# Altium integrated library all_in_one_library.IntLib: 677 symbols (part 1 of 3) (continued)
## CON_USB_mini_B_stoj
designator J?, comment USB
USB mini B THT 0°
footprint USB_MINI_stoj
pins: 1, 2, 3, 4, 5

## CON_zdierka
designator J?, comment Zdierka  (mechanical)
pins: 1

## CON_ZIF_EA_WF100-04S
designator J?
footprint CON_ZIF_EA_WF100-04S
pins: 1, 2, 3, 4

## DIODE_0805
designator D?
0.5A 0805
footprint 0805_SD1
pins: A, K

## DIODE_B130LAW
designator D?, comment B130LAW  (value not drawn)
SCHOT, 1A, 30V, SOD123; Link: http://cz.farnell.com/diodes-inc/b130law-7-f/diode-rec-schot-1a-30v-sod123/dp/1858617
footprint SOD123_DIODE
pins: A, K

## DIODE_B260-13-F
designator D?, comment B260
DIODE, REC, SCHOTTKY, 60V, 2A, SMB; Alias: B260-13-F; Suplier: Farnell
footprint Diode SMB
pins: A, K

## DIODE_CAN_TVS
designator D?
ESDCAN01-2BLY
footprint SOT23M
pins: 1, 2, 3

## DIODE_CHOTTKY_1A_30V_PMEG3010EJ
designator D?, comment PMEG3010EJ
1A, 30V, 560mV max, Schottky diode; Manufacturer: NXP; Case: SOD-323F; I_F: 1A; V_R: 30V; V_F: 560mV; PartNumber: PMEG3010EJ
footprint SOD323F (diode_smd)
pins: A, K

## DIODE_FFP08S60SNTU
designator D?, comment FFP08S60SNTU  (value not drawn)
Stealth DIODE, 600V, 8A FFP08S60SNTU; Alias: FFP08S60SNTU
footprint TO220D 2L (diode)
footprint TO220D 2L PWR (diode)
footprint TO220D 2L BENT (bent 2pin to220)
pins: A, K

## DIODE_IDP08E65D1XKSA1
designator D?, comment IDP08E65D1XKSA1
650V, 16A@25deg IDP08E65D1XKSA1; Current@25deg: 16A; ForwardVoltage: 1.35V; link: http://www.tme.eu/cz/details/idp08e65d1xksa1/univerzalni-diody-tht/infineon-technologies/; BRVoltage: 650V
footprint TO220D 2L (diode)
footprint TO220D 2L PWR (diode)
footprint TO220D 2L BENT (bent 2pin to220)
pins: A, K

## DIODE_MBR4045
designator D?, comment MBR4045
Dual power shotky diode; Suplier: Farnell; Alias: MBR4045
footprint TO-247AC PWR (SIP with Mounting Hole; 3 Leads; Body 20 x 15.6 x 5 mm (typ); Pitch 5.45 mm)
part A pins: 1 A1, 2 K
part B pins: 2 K, 3 A2

## DIODE_PMEG4010ETR
designator D?, comment PMEG4010ETR  (value not drawn)
FAST, SCHOTTKY, 1A, 40V, SOD123; Link: http://cz.farnell.com/nxp/pmeg4010etr/diode-schottky-1a-40v-sod123/dp/2311223
footprint SOD123_DIODE
pins: A, K

## DIODE_RS07J-GS18
designator D?, comment RS07J-GS18  (value not drawn)
D-SWITCH, 600V, 0.5A.DO-219AB; Alias: RS07J-GS18
footprint DO-219AB
pins: A, K

## DIODE_SK54
designator D?, comment SK54
Shottky 40V 5A; Suplier: Farnell; Alias: SK54C
footprint DIODE SMC (DO214AB) (Shottky Diode)
pins: A, K

## DIODE_TL431
designator Reg?
programable zener diode
footprint TL431-SOT23
footprint TO92; pin to pad Anode>2 Cathode>1 Vref>3
pins: Anode, Cathode, Vref

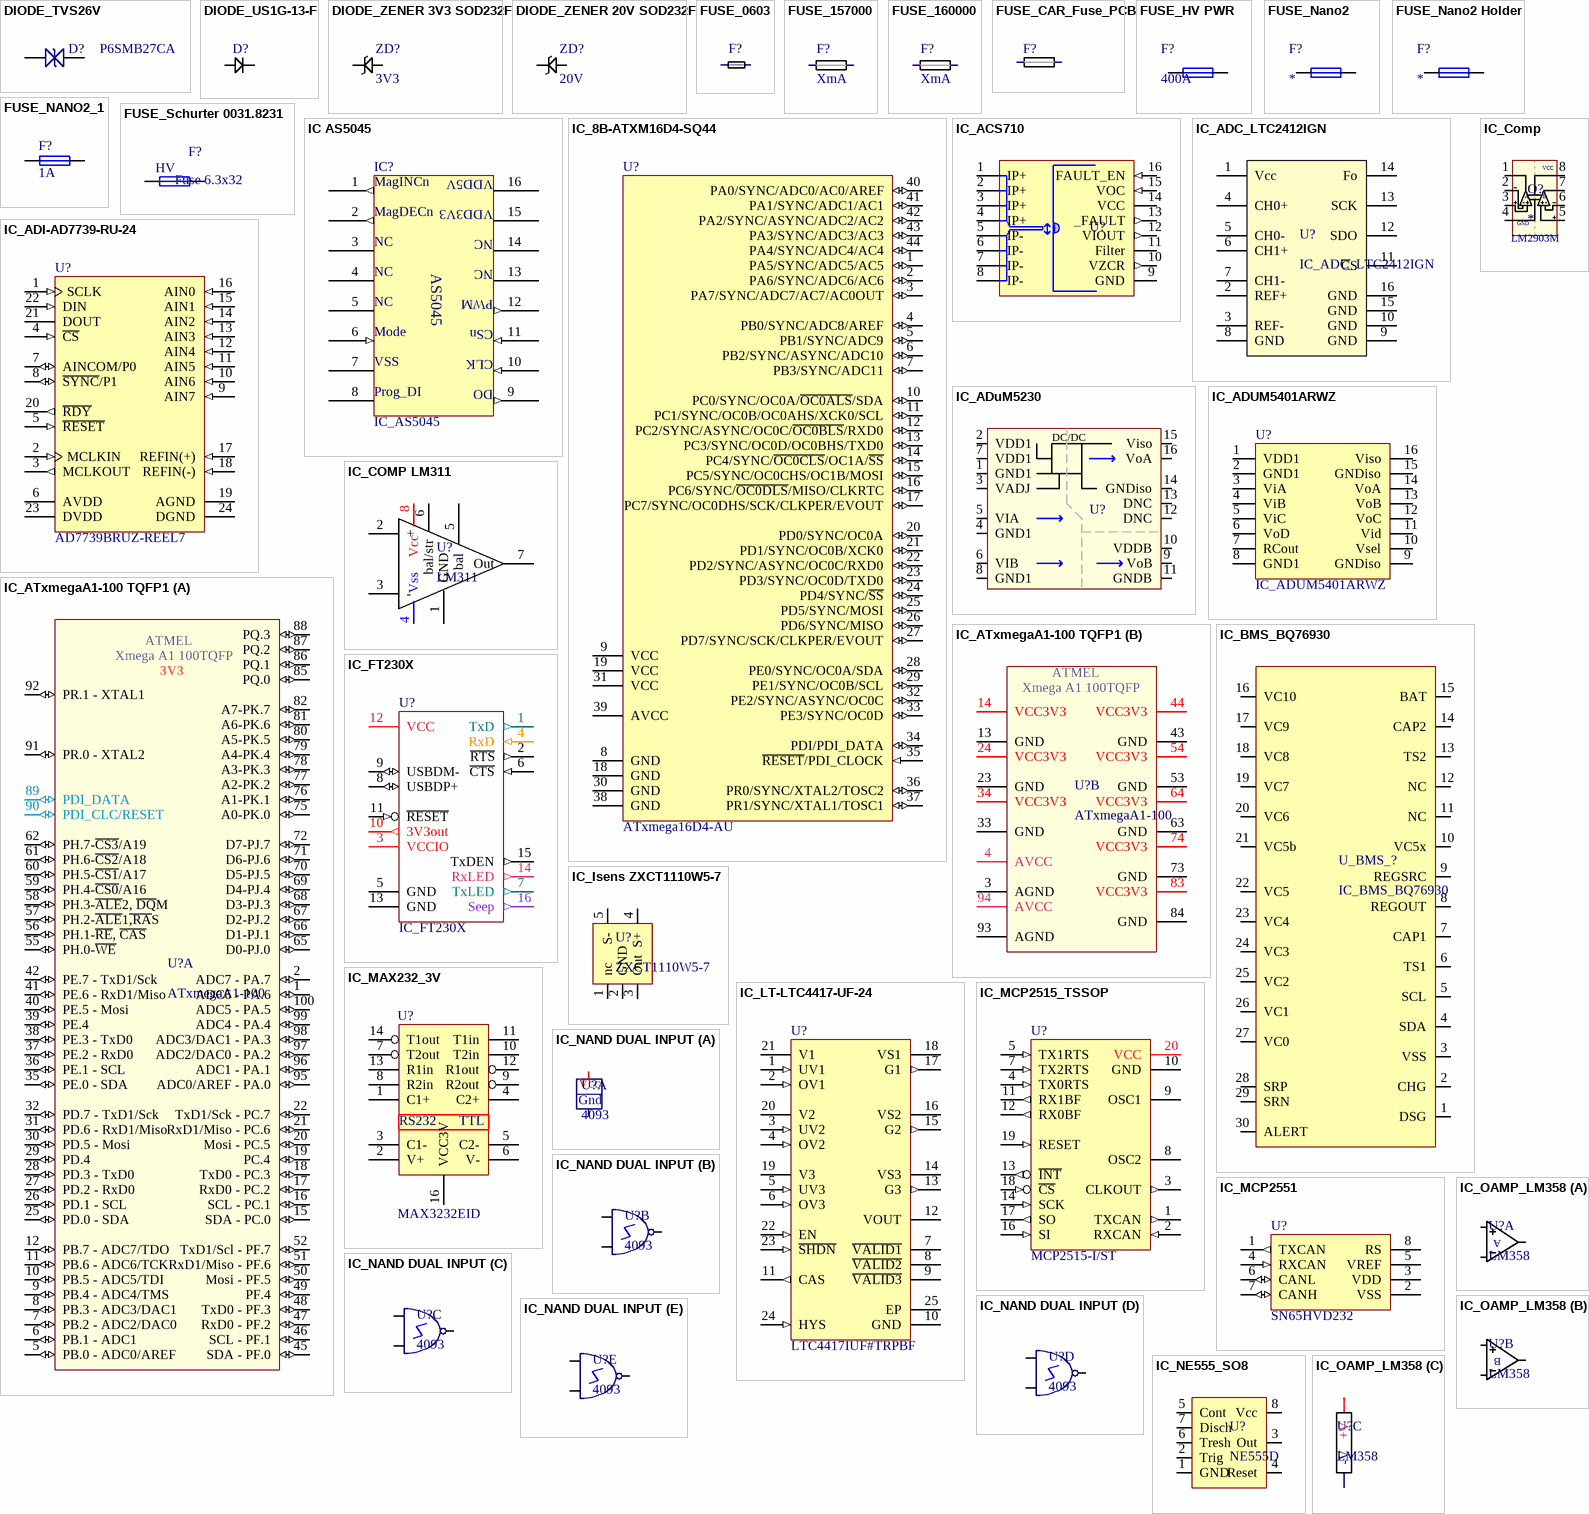
[diagram p4: symbols DIODE_TVS26V to IC_OAMP_LM358]

## DIODE_TVS26V
designator D?, comment P6SMB27CA
TVS DIODE; Alias: P6SMB27CA
footprint Diode SMB
pins: A 1, K 2

## DIODE_US1G-13-F
designator D?, comment US1G-13-F  (value not drawn)
UltraFast, 1A, 400V, SMA; Link: http://cz.farnell.com/diodes-inc/us1g-13-f/diode-rectif-ultra-fast-400v-1a/dp/1858638
footprint SMA_vishay
pins: A, K

## DIODE_ZENER 3V3 SOD232F
designator ZD?, comment 3V3
footprint ZENER SOD323F
pins: A, K

## DIODE_ZENER 20V SOD232F
designator ZD?, comment 20V
Alias: TDZ20J
footprint ZENER SOD323F
pins: A, K

## FUSE_0603
designator F?, comment 0.5A  (value not drawn)
fuse 0603 0.5A
footprint FS_0603 (fuse)
pins: 0, 1

## FUSE_157000
designator F?, comment XmA
2.6x6.1mm 62mA-15A 65/125V; Datasheet: http://www.gme.cz/img/cache/doc/971/020/fsf00-5-smd-datasheet-1.pdf; Supplier: ZVERIMEX
footprint FUSE_type_157000 (2.6x6.1mm)
pins: 0, 1

## FUSE_160000
designator F?, comment XmA
8x4,5x4,5mm 32mA-1A 250VAC; Datasheet: http://www.tme.eu/cz/Document/91a05b3a769bd3327ee844d3ba48aac9/SIBA-GSS-160000.pdf; Supplier: TME
footprint FUSE_160000 (8x4,5x4,5mm-SIBA-FUSES)
pins: 1, 2

## FUSE_CAR_Fuse_PCB
designator F?, comment CAR_fuse  (value not drawn)
Drzak autopojistky PCB 20A 32V
footprint CAR_Fuse_PCB
pins: 0, 1

## FUSE_HV PWR
designator F?, comment 400A
400A SemiC
pins: 1, 2

## FUSE_Nano2
designator F?
Fuse Nano2 bez puzdra
footprint Fuse Nano2
pins: 1, 2

## FUSE_Nano2 Holder
designator F?
Fuse Nano2 s puzdrom
footprint Fuse Nano2 Holder
pins: 1, 2

## FUSE_NANO2_1
designator F?, comment 1A
pojistka NANO2
footprint Fuse Nano2
pins: 1, 2

## FUSE_Schurter 0031.8231
designator F?, comment Fuse 6.3x32  Rating: HV
6.3x32 / 5x20
footprint FUSE 6.3x32mm (case HV)
pins: 1, 2

## IC AS5045
designator IC?, comment IC_AS5045
footprint SSOP16-AS5045 _nohole
footprint SSOP16-AS5045
pins: 1 (out) "MagINCn", 2 (out) "MagDECn", 3 "NC", 4 "NC", 5 "NC", 6 (in) "Mode", 7 (power) "VSS", 8 "Prog_DI", 9 (out) "DO", 10 (in) "CLK", 11 (in) "CSn", 12 (out) "PWM", 13 "NC", 14 "NC", 15 (power) "VDD3V3", 16 (power) "VDD5V"
text: VDD5V; MagINCn; VDD3V3; MagDECn; NC; AS5045; PWM; CSn; Mode; CLK; VSS; DO; Prog_DI

## IC_8B-ATXM16D4-SQ44
designator U?, comment ATxmega16D4-AU
8/16-bit AVR XMEGA D4 Microcontroller, 1.6-3.6V, 32MHz, 16KB + 4KB Flash, 1KB EEPROM, 2KB SRAM, 44-pin TQFP, Industrial Grade (-40°C to 85°C), Pb-Free; Manufacturer: Atmel; PartNumber: ATxmega16D4-AU; RevisionNote: update URL version and symbol Pin7,10,12,14,16,17,27,35,36,37改动; ComponentLink2URL: http://www.atmel.com/Images/Atmel-8135-8-and-16-bit-AVR-microcontroller-ATxmega16D4-32D4-64D4-128D4_datasheet.pdf; PackageDescription: 44-Pin Plastic Thin Profile Quad Flat Pack, 10 x 10 x 1.0 mm Body, 0.8 mm Pitch (TQFP); ComponentLink1Description: Manufacturer URL; Code_JEDEC: MS-026-ACB; ComponentLink2Description: Datasheet; DatasheetVersion: revP, Jan-2014; PackageReference: 44A; ComponentLink1URL: http://www.atmel.com/; PackageVersion: revC, Oct-2010
footprint TQFP44_Atmel
pins: 1 PA5/SYNC/ADC5/AC5 (io), 2 PA6/SYNC/ADC6/AC6 (io), 3 PA7/SYNC/ADC7/AC7/AC0OUT (io), 4 PB0/SYNC/ADC8/AREF (io), 5 PB1/SYNC/ADC9 (io), 6 PB2/SYNC/ASYNC/ADC10 (io), 7 PB3/SYNC/ADC11 (io), 8 GND (power), 9 VCC (power), 10 PC0/SYNC/OC0A/~{OC0ALS}/SDA (io), 11 PC1/SYNC/OC0B/OC0AHS/XCK0/SCL (io), 12 PC2/SYNC/ASYNC/OC0C/~{OC0BLS}/RXD0 (io), 13 PC3/SYNC/OC0D/OC0BHS/TXD0 (io), 14 PC4/SYNC/~{OC0CLS}/OC1A/~{SS} (io), 15 PC5/SYNC/OC0CHS/OC1B/MOSI (io), 16 PC6/SYNC/~{OC0DLS}/MISO/CLKRTC (io), 17 PC7/SYNC/OC0DHS/SCK/CLKPER/EVOUT (io), 18 GND (power), 19 VCC (power), 20 PD0/SYNC/OC0A (io), 21 PD1/SYNC/OC0B/XCK0 (io), 22 PD2/SYNC/ASYNC/OC0C/RXD0 (io), 23 PD3/SYNC/OC0D/TXD0 (io), 24 PD4/SYNC/~{SS} (io), 25 PD5/SYNC/MOSI (io), 26 PD6/SYNC/MISO (io), 27 PD7/SYNC/SCK/CLKPER/EVOUT (io), 28 PE0/SYNC/OC0A/SDA (io), 29 PE1/SYNC/OC0B/SCL (io), 30 GND (power), 31 VCC (power), 32 PE2/SYNC/ASYNC/OC0C (io), 33 PE3/SYNC/OC0D (io), 34 PDI/PDI_DATA (io), 35 ~{RESET}/PDI_CLOCK (in), 36 PR0/SYNC/XTAL2/TOSC2 (io), 37 PR1/SYNC/XTAL1/TOSC1 (io), 38 GND (power), 39 AVCC (power), 40 PA0/SYNC/ADC0/AC0/AREF (io), 41 PA1/SYNC/ADC1/AC1 (io), 42 PA2/SYNC/ASYNC/ADC2/AC2 (io), 43 PA3/SYNC/ADC3/AC3 (io), 44 PA4/SYNC/ADC4/AC4 (io)

## IC_ACS710
designator U?, comment ACS710KLATR  (value not drawn)
Current sensor +-12 +-25A; Alias: ACS710KLATR
footprint SOIC_16o
pins: 1 IP+, 2 IP+, 3 IP+, 4 IP+, 5 IP-, 6 IP-, 7 IP-, 8 IP-, 9 GND, 10 VZCR (out), 11 Filter, 12 VIOUT (out), 13 _FAULT (out), 14 VCC, 15 VOC (in), 16 FAULT_EN (in)

## IC_ADC_LTC2412IGN
designator U?
2 channel diferential sigma delta ADC
footprint SSOP16_N
pins: 1 Vcc (power), 2 REF+ (power), 3 REF- (power), 4 CH0+ (power), 5 CH0- (power), 6 CH1+ (power), 7 CH1- (power), 8 GND (power), 9 GND (power), 10 GND (power), 11 ~{C}S (power), 12 SDO (power), 13 SCK (power), 14 Fo (power), 15 GND (power), 16 GND (power)

## IC_ADI-AD7739-RU-24
designator U?, comment AD7739BRUZ-REEL7
Octal 24-Bit Sigma-Delta Analog-to-Digital Converter with Serial, SPI Interface, 15.1KSPS, -40 to +105 degC, RU-24, Pb-Free, Reel; Manufacturer: Analog Devices; Generic Part Number: AD7739; Channels: 8; Throughput Rate (SPS): 15.1K; Resolution (Bits): 24; Interface: Ser, SPI; PackageReference: RU-24; ComponentLink4Description: Product URL; PackageDescription: 24-Lead Thin Shrink Small Outline Package [TSSOP]; ComponentLink2URL: http://www.analog.com/static/imported-files/data_sheets/AD7739.pdf; ComponentLink4URL: http://www.analog.com/en/analog-to-digital-converters/ad-converters/ad7739/products/product.html; RoHS: Y; DatasheetVersion: Rev.0; ComponentLink3Description: Package Specification; ComponentLink1Description: Manufacturer URL; ComponentLink3URL: http://www.analog.com/static/imported-files/packages/380523655245964505593671154107510036154RU24.pdf; PackageVersion: 2002; ComponentLink1URL: http://www.analog.com/en/index.html; ComponentLink2Description: Datasheet; PartNumber: AD7739BRUZ-REEL7; Packing: Reel; Code_JEDEC: MO-153-AD; Mounting Technology: Surface Mount
footprint TSSOP24_AD
pins: 1 SCLK (in) "Serial Clock. Schmitt triggered logic input. An external serial clock is applied to this input to transfer serial data to or from the AD7739.", 2 MCLKIN (in) "Master Clock Signal for the ADC. This can be provided in the form of a crystal/resonator or external clock. A crystal/resonator can be tied across the MCLKIN and MCLKOUT pins.Alternatively, MCLKIN can be driven with a CMOS (See Datasheet)", 3 MCLKOUT (out) "Master Clock Signal for the ADC. When the master clock for the device is a crystal/resonator, the crystal/resonator is connected between MCLKIN and MCLKOUT. If an external clock is applied to the MCLKIN, MCLKOUT provides an (See Datasheet)", 4 ~{CS} (in) "Chip Select. Active low Schmitt triggered logic input with an internal pull-up resistor.With this input hardwired low, the AD7739 can operate in its 3-wire interface mode using SCLK, DIN, and DOUT. C\S\ can be used to select (See Datasheet)", 5 ~{RESET} (in) "Schmitt Triggered Logic Input. Active low input that resets the control logic, interface logic, digital filter, analog modulator, and all on-chip registers of the part to power-on status. Effectively, everything on the part (See Datasheet)", 6 AVDD (power) "Analog Positive Supply Voltage, 5 V to AGND Nominal.", 7 AINCOM/P0 (io) "Analog Inputs Common Terminal/Digital Output. The function of this pin is determined by the P0 DIR bit in the I/O port register; the digital value can be written as the P0 bit in the I/O port register. The digital voltage is (See Datasheet)", 8 ~{SYNC}/P1 (io) "S\Y\N\C\/Digital Input/Digital Output. The pin direction is determined by the P1 DIR bit;the digital value can be read/written as the P1 bit in the I/O port register. When the SYNC bit in the I/O port register is set to 1, (See Datasheet)", 9 AIN7 (in) "Analog Inputs.", 10 AIN6 (in) "Analog Inputs.", 11 AIN5 (in) "Analog Inputs.", 12 AIN4 (in) "Analog Inputs.", 13 AIN3 (in) "Analog Inputs.", 14 AIN2 (in) "Analog Inputs.", 15 AIN1 (in) "Analog Inputs.", 16 AIN0 (in) "Analog Inputs.", 17 REFIN(+) (in) "Positive Terminal of the Differential Reference Input. REFIN(+) voltage potential can lie anywhere between AVDD and AGND. In normal circuit configuration, this pin should be connected to a 2.5 V reference voltage.", 18 REFIN(-) (in) "Negative Terminal of the Differential Reference Input. REFIN(-) voltage potential can lie anywhere between AVDD and AGND. In normal circuit configuration, this pin should be connected to a 0 V reference voltage.", 19 AGND (power) "Ground Reference Point for Analog Circuitry.", 20 ~{RDY} (out) "Logic Output. Used as a status output in both conversion mode and calibration mode. In conversion mode, a falling edge on this output indicates that either any channel or all channels have unread data available, according to (See Datasheet)", 21 DOUT (hiz) "Serial Data Output. Serial data is read from the output shift register on the part. This output shift register can contain information from any AD7739 register, depending on the address bits of the communications register.", 22 DIN (in) "Serial Data Input (Schmitt Triggered). Serial data is written to the input shift register on the part. Data from this input shift register is transferred to any AD7739 register,depending on the address bits of the (See Datasheet)", 23 DVDD (power) "Digital Supply Voltage, 3 V or 5 V Nominal.", 24 DGND (power) "Ground Reference Point for Digital Circuitry."

## IC_ADuM5230
designator U?  (value not drawn)
Isolated driver with dc/dc 0.1/0.3A; Alias: ADuM5230
footprint SOIC_16o
pins: 1 GND1, 2 VDD1, 3 VADJ (in), 4 GND1, 5 VIA (in), 6 VIB (in), 7 VDD1, 8 GND1, 9 VoB (out), 10 VDDB, 11 GNDB, 12 DNC, 13 DNC, 14 GNDiso, 15 Viso, 16 VoA (out)
text: DC/DC

## IC_ADUM5401ARWZ
designator U?
Quad chanel isolators with DC-DC converter
footprint SOIC_16o
pins: 1 VDD1, 2 GND1, 3 ViA, 4 ViB, 5 ViC, 6 VoD, 7 RCout, 8 GND1, 9 GNDiso, 10 Vsel, 11 Vid, 12 VoC, 13 VoB, 14 VoA, 15 GNDiso, 16 Viso

## IC_ATxmegaA1-100 TQFP1
designator U?, comment ATxmegaA1-100
footprint TQ100
part A pins: 1 ADC6 - PA.6 (io), 2 ADC7 - PA.7 (io), 5 PB.0 - ADC0/AREF (io), 6 PB.1 - ADC1 (io), 7 PB.2 - ADC2/DAC0 (io), 8 PB.3 - ADC3/DAC1 (io), 9 PB.4 - ADC4/TMS (io), 10 PB.5 - ADC5/TDI (io), 11 PB.6 - ADC6/TCK (io), 12 PB.7 - ADC7/TDO (io), 15 SDA - PC.0 (io), 16 SCL - PC.1 (io), 17 RxD0 - PC.2 (io), 18 TxD0 - PC.3 (io), 19 PC.4 (io), 20 Mosi - PC.5 (io), 21 RxD1/Miso - PC.6 (io), 22 TxD1/Sck - PC.7 (io), 25 PD.0 - SDA (io), 26 PD.1 - SCL (io), 27 PD.2 - RxD0 (io), 28 PD.3 - TxD0 (io), 29 PD.4 (io), 30 PD.5 - Mosi (io), 31 PD.6 - RxD1/Miso (io), 32 PD.7 - TxD1/Sck (io), 35 PE.0 - SDA (io), 36 PE.1 - SCL (io), 37 PE.2 - RxD0 (io), 38 PE.3 - TxD0 (io), 39 PE.4 (io), 40 PE.5 - Mosi (io), 41 PE.6 - RxD1/Miso (io), 42 PE.7 - TxD1/Sck (io), 45 SDA - PF.0 (io), 46 SCL - PF.1 (io), 47 RxD0 - PF.2 (io), 48 TxD0 - PF.3 (io), 49 PF.4 (io), 50 Mosi - PF.5 (io), 51 RxD1/Miso - PF.6 (io), 52 TxD1/Scl - PF.7 (io), 55 PH.0-~{WE} (io), 56 PH.1-~{RE}, ~{CAS} (io), 57 PH.2-~{ALE}1~{,RA}S (io), 58 PH.3-~{ALE}2, ~{DQ}M (io), 59 PH.4-~{CS0}/A16 (io), 60 PH.5-~{CS1}/A17 (io), 61 PH.6-~{CS2}/A18 (io), 62 PH.7-~{CS3}/A19 (io), 65 D0-PJ.0 (io), 66 D1-PJ.1 (io), 67 D2-PJ.2 (io), 68 D3-PJ.3 (io), 69 D4-PJ.4 (io), 70 D5-PJ.5 (io), 71 D6-PJ.6 (io), 72 D7-PJ.7 (io), 75 A0-PK.0 (io), 76 A1-PK.1 (io), 77 A2-PK.2 (io), 78 A3-PK.3 (io), 79 A4-PK.4 (io), 80 A5-PK.5 (io), 81 A6-PK.6 (io), 82 A7-PK.7 (io), 85 PQ.0 (io), 86 PQ.1 (io), 87 PQ.2 (io), 88 PQ.3 (io), 89 PDI_DATA (io), 90 PDI_CLC/RESET (io), 91 PR.0 - XTAL2 (io), 92 PR.1 - XTAL1 (io), 95 ADC0/AREF - PA.0 (io), 96 ADC1 - PA.1 (io), 97 ADC2/DAC0 - PA.2 (io), 98 ADC3/DAC1 - PA.3 (io), 99 ADC4 - PA.4 (io), 100 ADC5 - PA.5 (io)
part B pins: 3 AGND (power), 4 AVCC (power), 13 GND (power), 14 VCC3V3 (power), 23 GND (power), 24 VCC3V3 (power), 33 GND (power), 34 VCC3V3 (power), 43 GND (power), 44 VCC3V3 (power), 53 GND (power), 54 VCC3V3 (power), 63 GND (power), 64 VCC3V3 (power), 73 GND (power), 74 VCC3V3 (power), 83 VCC3V3 (power), 84 GND (power), 93 AGND (power), 94 AVCC (power)
part A text: ATMEL; Xmega A1 100TQFP; 3V3
part B text: ATMEL; Xmega A1 100TQFP

## IC_BMS_BQ76930
designator U_BMS_?
Fuel Gauge, 6 to 10 cells, Lion/LiFePo; Manufacturer: texas instruments
footprint TSSOP-30 (TEXAS_INSTRUMENTS)
pins: 1 DSG, 2 CHG, 3 VSS, 4 SDA, 5 SCL, 6 TS1, 7 CAP1, 8 REGOUT, 9 REGSRC, 10 VC5x, 11 NC, 12 NC, 13 TS2, 14 CAP2, 15 BAT, 16 VC10, 17 VC9, 18 VC8, 19 VC7, 20 VC6, 21 VC5b, 22 VC5, 23 VC4, 24 VC3, 25 VC2, 26 VC1, 27 VC0, 28 SRP, 29 SRN, 30 ALERT

## IC_Comp
designator O?  Alias: LM2903M
comparator high speed
footprint SOIC8
pins: 1 OUT A, 2 -IN A, 3 +IN A, 4 GND, 5 +IN B, 6 -IN B, 7 OUT B, 8 V+
text: VCC; A; B

## IC_COMP LM311
designator U?, comment LM311
comparator 30V / 200ns
footprint SO8
pins: 1 GND, 2 +, 3 -, 4 Vss, 5 bal, 6 bal/str, 7 Out, 8 Vcc

## IC_FT230X
designator U?
FTDI FT232 USB/UART...
footprint SSOP16 (TSOP, 20-Leads, Body 7,0x4,6mm (max), Pitch 0,65mm, IPC Medium Density)
pins: 1 TxD (out), 2 ~{RTS} (out), 3 VCCIO (power), 4 RxD (in), 5 GND (power), 6 ~{CTS} (in), 7 TxLED (out), 8 USBDP+ (io), 9 USBDM- (io), 10 3V3out (out), 11 ~{RESET} (in), 12 VCC (power), 13 GND (power), 14 RxLED (out), 15 TxDEN (out), 16 Seep (out)

## IC_Isens ZXCT1110W5-7
designator U?, comment ZXCT1110W5-7
Current monitor ZXCT1110W5-7; Link: http://cz.farnell.com/diodes-inc/zxct1110w5-7/current-monitor-sot23-5/dp/1904030
footprint SOT23-5 (MAXIM package)
pins: 1 nc, 2 GND, 3 Out, 4 S+, 5 S-

## IC_LT-LTC4417-UF-24
designator U?, comment LTC4417IUF#TRPBF
Prioritized PowerPath Controller, 2.5 to 36 V Vin, 24-pin QFN (UF-24), -40 to 85 degC, Pb-Free, Tape and Reel; Manufacturer: Linear Technology; Ideal Diode: Triple, External, P-Channel; ComponentLink2Description: Datasheet; ComponentLink1Description: Manufacturer URL; PartNumber: LTC4417IUF#TRPBF; PackageDescription: 24-Pin Plastic QFN, Body 4 x 4 mm, Pitch 0.5 mm; RoHS: TRUE; PackageReference: UF24; ComponentLink3Description: Package Specification; Code_JEDEC: MO-220; ComponentLink1URL: http://www.linear.com/; ComponentLink2URL: http://cds.linear.com/docs/en/datasheet/4417f.pdf; PackageVersion: Rev. B, 02/2012; ComponentLink3URL: http://cds.linear.com/docs/en/packaging/%28UF24%29%20QFN%2005-08-1697%20Rev%20B.pdf; Packing: Tape and Reel; Mounting Technology: Surface Mount
footprint LT-UF-24_M (QFN, 24-Leads, Body 4.1x4.1mm, Pitch 0.5mm, Thermal Pad 2.45x2.45mm, IPC Low Density)
pins: 1 UV1 (in) "Undervoltage Comparator Inputs. Falling voltages below 1V signal an undervoltage event, invalidating the respective input supply channel. Connect UV1, UV2 and UV3 through a resistive divider between the respective V1, V2 and (See Datasheet)", 2 OV1 (in) "Overvoltage Comparator Inputs. Rising voltages above 1V signal an over voltage event, invalidating the respective input supply channel. Connect OV1, OV2 and OV3 to an external resistive divider from its respective V1, V2 and (See Datasheet)", 3 UV2 (in) "Undervoltage Comparator Inputs. Falling voltages below 1V signal an undervoltage event, invalidating the respective input supply channel. Connect UV1, UV2 and UV3 through a resistive divider between the respective V1, V2 and (See Datasheet)", 4 OV2 (in) "Overvoltage Comparator Inputs. Rising voltages above 1V signal an over voltage event, invalidating the respective input supply channel. Connect OV1, OV2 and OV3 to an external resistive divider from its respective V1, V2 and (See Datasheet)", 5 UV3 (in) "Undervoltage Comparator Inputs. Falling voltages below 1V signal an undervoltage event, invalidating the respective input supply channel. Connect UV1, UV2 and UV3 through a resistive divider between the respective V1, V2 and (See Datasheet)", 6 OV3 (in) "Overvoltage Comparator Inputs. Rising voltages above 1V signal an over voltage event, invalidating the respective input supply channel. Connect OV1, OV2 and OV3 to an external resistive divider from its respective V1, V2 and (See Datasheet)", 7 ~{VALID1} (oc) "Valid Channel Indicator Outputs. V\A\L\I\D\1\, V\A\L\I\D\2\ and V\A\L\I\D\3\ are high voltage open drain outputs that pull low when the respective V1, V2 and V3 are within the OV/UV window for at least 256ms and release when (See Datasheet)", 8 ~{VALID2} (oc) "Valid Channel Indicator Outputs. V\A\L\I\D\1\, V\A\L\I\D\2\ and V\A\L\I\D\3\ are high voltage open drain outputs that pull low when the respective V1, V2 and V3 are within the OV/UV window for at least 256ms and release when (See Datasheet)", 9 ~{VALID3} (oc) "Valid Channel Indicator Outputs. V\A\L\I\D\1\, V\A\L\I\D\2\ and V\A\L\I\D\3\ are high voltage open drain outputs that pull low when the respective V1, V2 and V3 are within the OV/UV window for at least 256ms and release when (See Datasheet)", 10 GND (power) "Device Ground.", 11 CAS (out) "Cascade Output. Digital output used for cascading multiple LTC4417s. Connect CAS to EN of another LTC4417 to increase the number of multiplexed input supplies. CAS is pulled up to the internal VLDO voltage by an internal (See Datasheet)", 12 VOUT (power) "Output Voltage Supply and Sense. VOUT is an output voltage sense pin used to prevent any input supply from connecting to the output if the output voltage is not at least 120mV below the input supply voltage. During normal (See Datasheet)", 13 G3 (out) "P-Channel MOSFET Gate Drive Outputs. G1, G2 and G3 are used to control external back-to-back Pchannel MOSFETs. When driven low, G1, G2 and G3 are clamped 6V below their corresponding VS1, VS2 and VS3. Connect G1, G2 and G3 (See Datasheet)", 14 VS3 (power) "External P-Channel MOSFET Common Source Connection. VS1, VS2 and VS3 supply the higher voltage of V1, V2 and V3 or VOUT to the gate drivers. Connect VS1, VS2 and VS3 to the respective common source connection of the (See Datasheet)", 15 G2 (out) "P-Channel MOSFET Gate Drive Outputs. G1, G2 and G3 are used to control external back-to-back Pchannel MOSFETs. When driven low, G1, G2 and G3 are clamped 6V below their corresponding VS1, VS2 and VS3. Connect G1, G2 and G3 (See Datasheet)", 16 VS2 (power) "External P-Channel MOSFET Common Source Connection. VS1, VS2 and VS3 supply the higher voltage of V1, V2 and V3 or VOUT to the gate drivers. Connect VS1, VS2 and VS3 to the respective common source connection of the (See Datasheet)", 17 G1 (out) "P-Channel MOSFET Gate Drive Outputs. G1, G2 and G3 are used to control external back-to-back Pchannel MOSFETs. When driven low, G1, G2 and G3 are clamped 6V below their corresponding VS1, VS2 and VS3. Connect G1, G2 and G3 (See Datasheet)", 18 VS1 (power) "External P-Channel MOSFET Common Source Connection. VS1, VS2 and VS3 supply the higher voltage of V1, V2 and V3 or VOUT to the gate drivers. Connect VS1, VS2 and VS3 to the respective common source connection of the (See Datasheet)", 19 V3 (power) "Third Priority Input Supply. When V3 is within its OV/UV window for 256ms, it is connected to VOUT via its external back-to-back P-channel MOSFETs only if V1 and V2 do not meet their OV/UV requirements. Connect to ground (See Datasheet)", 20 V2 (power) "Second Priority Input Supply. When V2 is within its OV/UV window for 256ms, it is connected to VOUT via its external back-to-back P-channel MOSFETs only if V1 does not meet its OV/UV requirements. Connect to ground when (See Datasheet)", 21 V1 (power) "Highest Priority Input Supply. When V1 is within its user defined OV/UV window for 256ms, it is connected to VOUT via its external back-to-back P-channel MOSFETs. Connect V1 to ground when channel is not used. See (See Datasheet)", 22 EN (in) "Channel Enable Input. EN is a high voltage input that allows the user to quickly connect and disconnect channels without resetting the OV/UV timers. When below 1V, all external back-to-back P-channel MOSFETs are driven off (See Datasheet)", 23 ~{SHDN} (in) "Shutdown Input. Driving S\H\D\N\ below 0.8V turns off all external back-to-back P-channel MOSFET devices, forces the LTC4417 into a low current state, and resets the 256ms timers used to validate V1, V2 and V3. Driving (See Datasheet)", 24 HYS (in) "OV/UV Comparator Hysteresis Input. Connecting HYS to ground sets a fixed 30mV hysteresis for the OV and UV comparators. Connecting a resistor, RHYS, between HYS and ground disables the internal 30mV hysteresis and sets a (See Datasheet)", 25 EP (power) "Exposed pad may be left open or connected to device ground."

## IC_MAX232_3V
designator U?, comment MAX3232EID
Budic pro RS 232
footprint SO16
pins: 1 C1+, 2 V+, 3 C1-, 4 C2+, 5 C2-, 6 V-, 7 T2out, 8 R2in, 9 R2out, 10 T2in, 11 T1in, 12 R1out, 13 R1in, 14 T1out, 15 GND (power) hidden to GND, 16 VCC3V (power)
text: RS232; TTL

## IC_MCP2515_TSSOP
designator U?, comment MCP2515-I/ST
MCP2515 CAN
footprint TSSOP20 (TSSOP, 20-Leads, Body 6,6x4,5mm (max), Pitch 0,65mm, IPC Medium Density)
pins: 1 TXCAN (out), 2 RXCAN (in), 3 CLKOUT (out), 4 TX0RTS (in), 5 TX1RTS (in), 7 TX2RTS (in), 8 OSC2, 9 OSC1, 10 GND (power), 11 RX1BF (out), 12 RX0BF (out), 13 ~{INT} (out), 14 SCK (in), 16 SI (in), 17 SO (out), 18 ~{CS} (in), 19 RESET (in), 20 VCC (power)

## IC_MCP2551
designator U?, comment SN65HVD232
MCP2551
footprint SO8
pins: 1 TXCAN (out), 2 VSS (power), 3 VDD (power), 4 RXCAN (in), 5 VREF (power), 6 CANL (io), 7 CANH (io), 8 RS

## IC_NAND DUAL INPUT
designator U?, comment 4093
CMOS 4093 Quad 2input nand
footprint SO14
part A pins: 7 GND, 14 VCC
part B pins: 1 Ain1, 2 Ain2, 3 Aout
part C pins: 4 Bout, 5 Bin1, 6 Bin2
part D pins: 8 Cin1, 9 Cin2, 10 Cout
part E pins: 11 Dout, 12 Din1, 13 Din2
part A text: Vcc; Gnd

## IC_NE555_SO8
designator U?, comment NE555D
NE555D 5-15V timing operation circuit; Link: http://cz.farnell.com/texas-instruments/ne555d/timer-single-precision-soic8-555/dp/9589880
footprint SO8
pins: 1 GND, 2 Trig, 3 Out, 4 Reset, 5 Cont, 6 Tresh, 7 Disch, 8 Vcc

## IC_OAMP_LM358
designator U?, comment LM358
General oamp, 3 - 32V supply; Alias: LM358
footprint SOIC8
part A pins: 1 outA, 2 -inA, 3 +inA
part B pins: 5 +inB, 6 -inB, 7 outB
part C pins: 4 -V, 8 +V
part A text: A
part B text: B

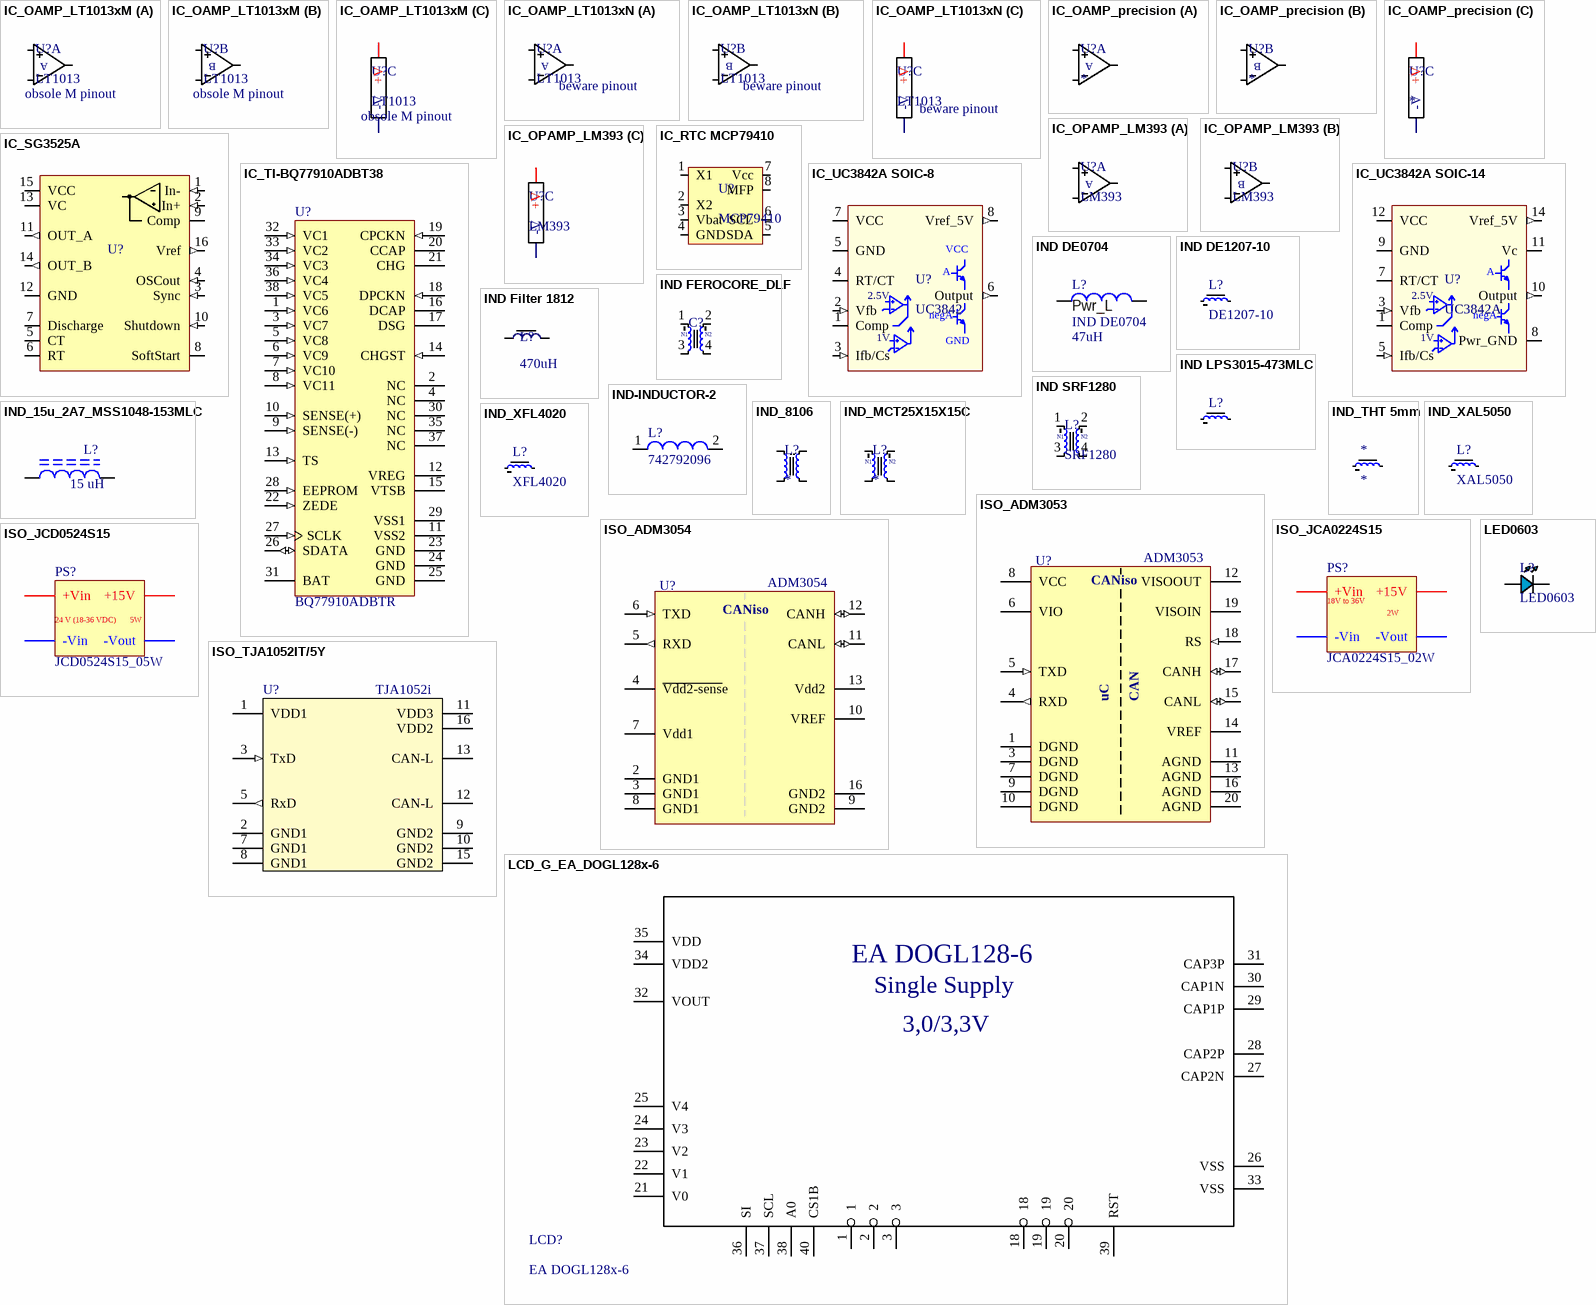
[diagram p5: symbols IC_OAMP_LT1013xM to LED0603]

## IC_OAMP_LT1013xM
designator U?, comment LT1013  packaging-pinout: obsole M pinout
5V /+-15V, Dual Precision Op Amp; Alias: LT1013
footprint SOIC8
part A pins: 1 outA, 2 -inA, 3 +inA
part B pins: 5 +inB, 6 -inB, 7 outB
part C pins: 4 -V, 8 +V
part A text: A
part B text: B

## IC_OAMP_LT1013xN
designator U?, comment LT1013  packaging-pinout: beware pinout
5V /+-15V, Dual Precision Op Amp; Alias: LT1013
footprint SOIC8
part A pins: 1 +inA, 7 outA, 8 -inA
part B pins: 3 +inB, 4 -inB, 5 outB
part C pins: 2 -V, 6 +V
part A text: A
part B text: B

## IC_OAMP_precision
designator U?
AD8672ARMZ precision operation amplifier high gain; Alias: AD8672ARMZ
footprint SOIC8
part A pins: 1 outA, 2 -inA, 3 +inA
part B pins: 5 +inB, 6 -inB, 7 outB
part C pins: 4 -V, 8 +V
part A text: A
part B text: B

## IC_OPAMP_LM393
designator U?, comment LM393
General comparator, 2 - 32V supply; link: http://www.tme.eu/cz/details/lm393d-st/komparatory-smd/st-microelectronics/lm393d/
footprint SOIC8
part A pins: 1 outA, 2 -inA, 3 +inA
part B pins: 5 +inB, 6 -inB, 7 outB
part C pins: 4 -V, 8 +V
part A text: A
part B text: B

## IC_RTC MCP79410
designator U?, comment MCP79410
Real-Time Clock/Calendar with EEPROM, SRAM,   Unique ID and Battery Switchover; Suplier: Farnell; Alias: MCP79410; Datasheet: http://ww1.microchip.com/downloads/en/DeviceDoc/22266D.pdf
footprint TSSOP8
pins: 1 X1, 2 X2, 3 Vbat, 4 GND, 5 SDA, 6 SCL, 7 Vcc, 8 MFP

## IC_SG3525A
designator U?, comment PWM controller  (value not drawn)
Pulse Width Modulator  Control Circuit; Alias: SG3525A
footprint so16
pins: 1 In- (in), 2 In+ (in), 3 Sync (in), 4 OSCout (in), 5 CT, 6 RT, 7 Discharge, 8 SoftStart, 9 Comp, 10 Shutdown (in), 11 OUT_A (out), 12 GND, 13 VC, 14 OUT_B (out), 15 VCC, 16 Vref (out)

## IC_TI-BQ77910ADBT38
designator U?, comment BQ77910ADBTR
Standalone 4-10 Cell Precision Protector for Li-Ion Chemistries, -40 to 85 degC, 38-pin TSSOP (DBT), Green (RoHS & no Sb/Br); Manufacturer: Texas Instruments; SubFamily: Battery Charge Management; Lead Acid: N; Over Voltage Protection: Y; PackageDescription: 38-Pin Plastic Small Outline 0.5 mm Pitch; Eco-Plan: Green (RoHS & no Sb/Br); NiCd: N; DatasheetVersion: SLUSAV6; Code_JEDEC: MO-153; NiMH: N; PartNumber: BQ77910ADBTR; PackageVersion: revI, Mar-2011; ComponentLink1Description: Datasheet; Mounting Technology: Surface Mount; ComponentLink1URL: http://www.ti.com/general/docs/lit/getliterature.tsp?genericPartNumber=BQ77910A&fileType=pdf; Li-Ion: Y; Li-Polymer: Y; PackageReference: DBT38
footprint SSOP38_TI
pins: 1 VC6 (in) "Sense-voltage input terminal for sixth-most-positive cell.", 2 NC "No connect (DO NOT CONNECT) externally. Failure to leave NC pins open can cause faulty operation.", 3 VC7 (in) "Sense-voltage input terminal for seventh-most-positive cell.", 4 NC "No connect (DO NOT CONNECT) externally. Failure to leave NC pins open can cause faulty operation.", 5 VC8 (in) "Sense-voltage input terminal for eighth-most-positive cell.", 6 VC9 (in) "Sense-voltage input terminal for ninth-most-positive cell.", 7 VC10 (in) "Sense-voltage input terminal for tenthmost-positive (most-negative) cell.", 8 VC11 (in) "Most-negative cell(-) terminal (BAT-).", 9 SENSE(-) (in) "Current-sense input.", 10 SENSE(+) (in) "Current-sense input.", 11 VSS2 (power) "Analog ground (substrate reference).", 12 VREG (power) "Integrated 3.3-V regulator output.", 13 TS (in) "Temperature sensing input.", 14 CHGST (in) "Charger-status input, used to detect charger connection/wakeup.", 15 VTSB "Thermistor bias supply (sourced from VREG).", 16 DCAP "Energy storage capacitor for discharge FET drive.", 17 DSG "Discharge FET (n-channel) gate drive.", 18 DPCKN (in) "Pack - discharge negative terminal (load return).", 19 CPCKN (in) "Pack - charger negative terminal (charger return).", 20 CCAP "Energy storage capacitor for charge FET drive.", 21 CHG "Charge FET (n-channel) gate drive.", 22 ZEDE (in) "Zero Delay test mode pin. Enables serial communications interface and minimizes protection delay times when connected to logic high. Connect to VSS for normal operation. A strong connection is recommended.", 23 GND (power) "Logic ground (not for power return or analog reference). Tie to VSS.", 24 GND (power) "Logic ground (not for power return or analog reference). Tie to VSS.", 25 GND (power) "Logic ground (not for power return or analog reference). Tie to VSS.", 26 SDATA (io) "Serial-communication data input/output used for EEPROM programming (open-drain).", 27 SCLK (in) "Serial-communication clock input used for EEPROM programming.", 28 EEPROM (in) "EEPROM programming voltage input. Connect to VSS for normal operation.", 29 VSS1 (power) "Analog ground (substrate reference).", 30 NC "No connect (DO NOT CONNECT) externally. Failure to leave NC pins open can cause faulty operation.", 31 BAT (power) "Power supply voltage, tied to highest cell(+).", 32 VC1 (in) "Sense-voltage input terminal for most-positive cell.", 33 VC2 (in) "Sense-voltage input terminal for second-most-positive cell.", 34 VC3 (in) "Sense-voltage input terminal for third-most-positive cell.", 35 NC "No connect (DO NOT CONNECT) externally. Failure to leave NC pins open can cause faulty operation.", 36 VC4 (in) "Sense-voltage input terminal for fourth-most-positive cell.", 37 NC "No connect (DO NOT CONNECT) externally. Failure to leave NC pins open can cause faulty operation.", 38 VC5 (in) "Sense-voltage input terminal for fifth-most-positive cell."

## IC_UC3842A SOIC-8
designator U?, comment UC3842
Current mode pwm controller; Alias: UC3842A
footprint SOIC8
pins: 1 Comp, 2 Vfb (in), 3 Ifb/Cs (in), 4 RT/CT, 5 GND, 6 Output (out), 7 VCC, 8 Vref_5V (out)
text: A; 2.5V; negA; 1V

## IC_UC3842A SOIC-14
designator U?, comment UC3842A
Current mode pwm controller; Alias: UC3842A
footprint SO14
pins: 1 Comp, 3 Vfb (in), 5 Ifb/Cs (in), 7 RT/CT, 8 Pwr_GND, 9 GND, 10 Output (out), 11 Vc, 12 VCC, 14 Vref_5V (out)
text: A; 2.5V; negA; 1V

## IND DE0704
designator L?  value 47uH
Pwr_Inductor DE0704
footprint DE0704
pins: 1, 2
text: Pwr_L